# Altium footprint library CONN_HDR_2.54MM_RA.PcbLib: 63 footprints (part 5 of 5)
Each footprint in its own frame and in the unit in brackets; x right, y up, seen from the top. Pads: shape width x height; smd on the part's side, far side on the other; paste and mask are expansions set on the pad; w line width, h text height; cw(c..) or ccw(c..) is an arc to the next point about the centre after c.
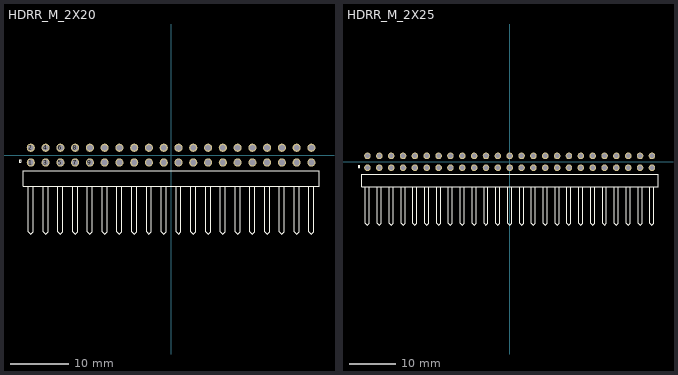
[diagram p4: the footprints below, top view; thin cyan lines are the x and y axes]

## HDRR_M_2X20 [mm] "Connector; Header; 20x2 Position"
height 7
pads (40):
  round 1.4 / inner round 1.4 / far side oval 1.4x2.2 hole 1: 1(-24.13,-1.27) 2(-24.13,1.27) 3(-21.59,-1.27) 4(-21.59,1.27) 5(-19.05,-1.27) 6(-19.05,1.27) 7(-16.51,-1.27) 8(-16.51,1.27) 9(-13.97,-1.27) 10(-13.97,1.27) 11(-11.43,-1.27) 12(-11.43,1.27) 13(-8.89,-1.27) 14(-8.89,1.27) 15(-6.35,-1.27) 16(-6.35,1.27) 17(-3.81,-1.27) 18(-3.81,1.27) 19(-1.27,-1.27) 20(-1.27,1.27) 21(1.27,-1.27) 22(1.27,1.27) 23(3.81,-1.27) 24(3.81,1.27) 25(6.35,-1.27) 26(6.35,1.27) 27(8.89,-1.27) 28(8.89,1.27) 29(11.43,-1.27) 30(11.43,1.27) 31(13.97,-1.27) 32(13.97,1.27) 33(16.51,-1.27) 34(16.51,1.27) 35(19.05,-1.27) 36(19.05,1.27) 37(21.59,-1.27) 38(21.59,1.27) 39(24.13,-1.27) 40(24.13,1.27)
Top Overlay:
  circle w0.2: c-25.96,-1.04 r0.2
  lines w0.2: -24.553,-5.31 -24.553,-13.197 -24.13,-13.62 -23.707,-13.197 -23.707,-5.31 ; -22.86,-5.31 -20.29,-5.31 ; -22.86,-2.7 -20.29,-2.7 ; -22.83,-5.31 -25.4,-5.31 -25.4,-2.7 -22.83,-2.7 ; -22.013,-5.31 -22.013,-13.197 -21.59,-13.62 -21.167,-13.197 -21.167,-5.31 ; -20.32,-5.31 -17.75,-5.31 ; -20.32,-2.7 -17.75,-2.7 ; -19.473,-5.31 -19.473,-13.197 -19.05,-13.62 -18.627,-13.197 -18.627,-5.31 ; -17.78,-5.31 -15.21,-5.31 ; -17.78,-2.7 -15.21,-2.7 ; -16.933,-5.31 -16.933,-13.197 -16.51,-13.62 -16.087,-13.197 -16.087,-5.31 ; -15.24,-5.31 -12.67,-5.31 ; -15.24,-2.7 -12.67,-2.7 ; -14.393,-5.31 -14.393,-13.197 -13.97,-13.62 -13.547,-13.197 -13.547,-5.31 ; -12.7,-5.31 -10.13,-5.31 ; -12.7,-2.7 -10.13,-2.7 ; -11.853,-5.31 -11.853,-13.197 -11.43,-13.62 -11.007,-13.197 -11.007,-5.31 ; -10.16,-5.31 -7.59,-5.31 ; -10.16,-2.7 -7.59,-2.7 ; -9.313,-5.31 -9.313,-13.197 -8.89,-13.62 -8.467,-13.197 -8.467,-5.31 ; -7.62,-5.31 -5.05,-5.31 ; -7.62,-2.7 -5.05,-2.7 ; -6.773,-5.31 -6.773,-13.197 -6.35,-13.62 -5.927,-13.197 -5.927,-5.31 ; -5.08,-5.31 -2.51,-5.31 ; -5.08,-2.7 -2.51,-2.7 ; -4.233,-5.31 -4.233,-13.197 -3.81,-13.62 -3.387,-13.197 -3.387,-5.31 ; -2.54,-5.31 0.03,-5.31 ; -2.54,-2.7 0.03,-2.7 ; -1.693,-5.31 -1.693,-13.197 -1.27,-13.62 -0.847,-13.197 -0.847,-5.31 ; 0,-5.31 2.57,-5.31 ; 0,-2.7 2.57,-2.7 ; 0.847,-5.31 0.847,-13.197 1.27,-13.62 1.693,-13.197 1.693,-5.31 ; 2.54,-5.31 5.11,-5.31 ; 2.54,-2.7 5.11,-2.7 ; 3.387,-5.31 3.387,-13.197 3.81,-13.62 4.233,-13.197 4.233,-5.31 ; 5.08,-5.31 7.65,-5.31 ; 5.08,-2.7 7.65,-2.7 ; 5.927,-5.31 5.927,-13.197 6.35,-13.62 6.773,-13.197 6.773,-5.31 ; 7.62,-5.31 10.19,-5.31 ; 7.62,-2.7 10.19,-2.7 ; 8.467,-5.31 8.467,-13.197 8.89,-13.62 9.313,-13.197 9.313,-5.31 ; 10.16,-5.31 12.73,-5.31 ; 10.16,-2.7 12.73,-2.7 ; 11.007,-5.31 11.007,-13.197 11.43,-13.62 11.853,-13.197 11.853,-5.31 ; 12.7,-5.31 15.27,-5.31 ; 12.7,-2.7 15.27,-2.7 ; 13.547,-5.31 13.547,-13.197 13.97,-13.62 14.393,-13.197 14.393,-5.31 ; 15.24,-5.31 17.81,-5.31 ; 15.24,-2.7 17.81,-2.7 ; 16.087,-5.31 16.087,-13.197 16.51,-13.62 16.933,-13.197 16.933,-5.31 ; 17.78,-5.31 20.35,-5.31 ; 17.78,-2.7 20.35,-2.7 ; 18.627,-5.31 18.627,-13.197 19.05,-13.62 19.473,-13.197 19.473,-5.31 ; 20.32,-5.31 22.89,-5.31 ; 20.32,-2.7 22.89,-2.7 ; 21.167,-5.31 21.167,-13.197 21.59,-13.62 22.013,-13.197 22.013,-5.31 ; 22.86,-5.31 25.43,-5.31 25.43,-2.7 22.86,-2.7 ; 23.707,-5.31 23.707,-13.197 24.13,-13.62 24.553,-13.197 24.553,-5.31
3D body "2x1 Male Pin Header Angle.STEP": height 5.04, standoff -2.96, extent 22.855,-13.34 25.4,1.56
3D body "2x1 Male Pin Header Angle.STEP": height 5.04, standoff -2.96, extent 20.315,-13.34 22.86,1.56
3D body "2x1 Male Pin Header Angle.STEP": height 5.04, standoff -2.96, extent 17.775,-13.34 20.32,1.56
3D body "2x1 Male Pin Header Angle.STEP": height 5.04, standoff -2.96, extent -25.405,-13.34 -22.86,1.56
3D body "2x1 Male Pin Header Angle.STEP": height 5.04, standoff -2.96, extent -22.865,-13.34 -20.32,1.56
3D body "2x1 Male Pin Header Angle.STEP": height 5.04, standoff -2.96, extent -20.325,-13.34 -17.78,1.56
3D body "2x1 Male Pin Header Angle.STEP": height 5.04, standoff -2.96, extent -17.785,-13.34 -15.24,1.56
3D body "2x1 Male Pin Header Angle.STEP": height 5.04, standoff -2.96, extent -15.245,-13.34 -12.7,1.56
3D body "2x1 Male Pin Header Angle.STEP": height 5.04, standoff -2.96, extent -12.705,-13.34 -10.16,1.56
3D body "2x1 Male Pin Header Angle.STEP": height 5.04, standoff -2.96, extent -10.165,-13.34 -7.62,1.56
3D body "2x1 Male Pin Header Angle.STEP": height 5.04, standoff -2.96, extent -7.625,-13.34 -5.08,1.56
3D body "2x1 Male Pin Header Angle.STEP": height 5.04, standoff -2.96, extent -5.085,-13.34 -2.54,1.56
3D body "2x1 Male Pin Header Angle.STEP": height 5.04, standoff -2.96, extent -2.545,-13.34 0,1.56
3D body "2x1 Male Pin Header Angle.STEP": height 5.04, standoff -2.96, extent -0.005,-13.34 2.54,1.56
3D body "2x1 Male Pin Header Angle.STEP": height 5.04, standoff -2.96, extent 2.535,-13.34 5.08,1.56
3D body "2x1 Male Pin Header Angle.STEP": height 5.04, standoff -2.96, extent 5.075,-13.34 7.62,1.56
3D body "2x1 Male Pin Header Angle.STEP": height 5.04, standoff -2.96, extent 7.615,-13.34 10.16,1.56
3D body "2x1 Male Pin Header Angle.STEP": height 5.04, standoff -2.96, extent 10.155,-13.34 12.7,1.56
3D body "2x1 Male Pin Header Angle.STEP": height 5.04, standoff -2.96, extent 12.695,-13.34 15.24,1.56
3D body "2x1 Male Pin Header Angle.STEP": height 5.04, standoff -2.96, extent 15.235,-13.34 17.78,1.56

## HDRR_M_2X25 [mm] "Connector; Header; 25x2 Position"
height 7
pads (50):
  round 1.4 / inner round 1.4 / far side oval 1.4x2.2 hole 1: 1(-30.48,-1.27) 2(-30.48,1.27) 3(-27.94,-1.27) 4(-27.94,1.27) 5(-25.4,-1.27) 6(-25.4,1.27) 7(-22.86,-1.27) 8(-22.86,1.27) 9(-20.32,-1.27) 10(-20.32,1.27) 11(-17.78,-1.27) 12(-17.78,1.27) 13(-15.24,-1.27) 14(-15.24,1.27) 15(-12.7,-1.27) 16(-12.7,1.27) 17(-10.16,-1.27) 18(-10.16,1.27) 19(-7.62,-1.27) 20(-7.62,1.27) 21(-5.08,-1.27) 22(-5.08,1.27) 23(-2.54,-1.27) 24(-2.54,1.27) 25(0,-1.27) 26(0,1.27) 27(2.54,-1.27) 28(2.54,1.27) 29(5.08,-1.27) 30(5.08,1.27) 31(7.62,-1.27) 32(7.62,1.27) 33(10.16,-1.27) 34(10.16,1.27) 35(12.7,-1.27) 36(12.7,1.27) 37(15.24,-1.27) 38(15.24,1.27) 39(17.78,-1.27) 40(17.78,1.27) 41(20.32,-1.27) 42(20.32,1.27) 43(22.86,-1.27) 44(22.86,1.27) 45(25.4,-1.27) 46(25.4,1.27) 47(27.94,-1.27) 48(27.94,1.27) 49(30.48,-1.27) 50(30.48,1.27)
Top Overlay:
  drawing of 153 lines, arcs and shapes, not listed
3D body "2x1 Male Pin Header Angle.STEP": height 5.04, standoff -2.96, extent 8.885,-13.34 11.43,1.56
3D body "2x1 Male Pin Header Angle.STEP": height 5.04, standoff -2.96, extent 6.345,-13.34 8.89,1.56
3D body "2x1 Male Pin Header Angle.STEP": height 5.04, standoff -2.96, extent 3.805,-13.34 6.35,1.56
3D body "2x1 Male Pin Header Angle.STEP": height 5.04, standoff -2.96, extent 1.265,-13.34 3.81,1.56
3D body "2x1 Male Pin Header Angle.STEP": height 5.04, standoff -2.96, extent -1.275,-13.34 1.27,1.56
3D body "2x1 Male Pin Header Angle.STEP": height 5.04, standoff -2.96, extent -3.815,-13.34 -1.27,1.56
3D body "2x1 Male Pin Header Angle.STEP": height 5.04, standoff -2.96, extent -6.355,-13.34 -3.81,1.56
3D body "2x1 Male Pin Header Angle.STEP": height 5.04, standoff -2.96, extent -8.895,-13.34 -6.35,1.56
3D body "2x1 Male Pin Header Angle.STEP": height 5.04, standoff -2.96, extent -11.435,-13.34 -8.89,1.56
3D body "2x1 Male Pin Header Angle.STEP": height 5.04, standoff -2.96, extent -13.975,-13.34 -11.43,1.56
3D body "2x1 Male Pin Header Angle.STEP": height 5.04, standoff -2.96, extent -16.515,-13.34 -13.97,1.56
3D body "2x1 Male Pin Header Angle.STEP": height 5.04, standoff -2.96, extent -19.055,-13.34 -16.51,1.56
3D body "2x1 Male Pin Header Angle.STEP": height 5.04, standoff -2.96, extent -21.595,-13.34 -19.05,1.56
3D body "2x1 Male Pin Header Angle.STEP": height 5.04, standoff -2.96, extent -24.135,-13.34 -21.59,1.56
3D body "2x1 Male Pin Header Angle.STEP": height 5.04, standoff -2.96, extent -26.675,-13.34 -24.13,1.56
3D body "2x1 Male Pin Header Angle.STEP": height 5.04, standoff -2.96, extent -29.215,-13.34 -26.67,1.56
3D body "2x1 Male Pin Header Angle.STEP": height 5.04, standoff -2.96, extent -31.755,-13.34 -29.21,1.56
3D body "2x1 Male Pin Header Angle.STEP": height 5.04, standoff -2.96, extent 11.425,-13.34 13.97,1.56
3D body "2x1 Male Pin Header Angle.STEP": height 5.04, standoff -2.96, extent 13.965,-13.34 16.51,1.56
3D body "2x1 Male Pin Header Angle.STEP": height 5.04, standoff -2.96, extent 16.505,-13.34 19.05,1.56
3D body "2x1 Male Pin Header Angle.STEP": height 5.04, standoff -2.96, extent 19.045,-13.34 21.59,1.56
3D body "2x1 Male Pin Header Angle.STEP": height 5.04, standoff -2.96, extent 21.585,-13.34 24.13,1.56
3D body "2x1 Male Pin Header Angle.STEP": height 5.04, standoff -2.96, extent 24.125,-13.34 26.67,1.56
3D body "2x1 Male Pin Header Angle.STEP": height 5.04, standoff -2.96, extent 26.665,-13.34 29.21,1.56
3D body "2x1 Male Pin Header Angle.STEP": height 5.04, standoff -2.96, extent 29.205,-13.34 31.75,1.56